# Altium footprint library TranDangKhoa-LIB.PcbLib: 1435 footprints (part 83 of 90)
Each footprint in its own frame and in the unit in brackets; x right, y up, seen from the top. Pads: shape width x height; smd on the part's side, far side on the other; paste and mask are expansions set on the pad; w line width, h text height; cw(c..) or ccw(c..) is an arc to the next point about the centre after c.
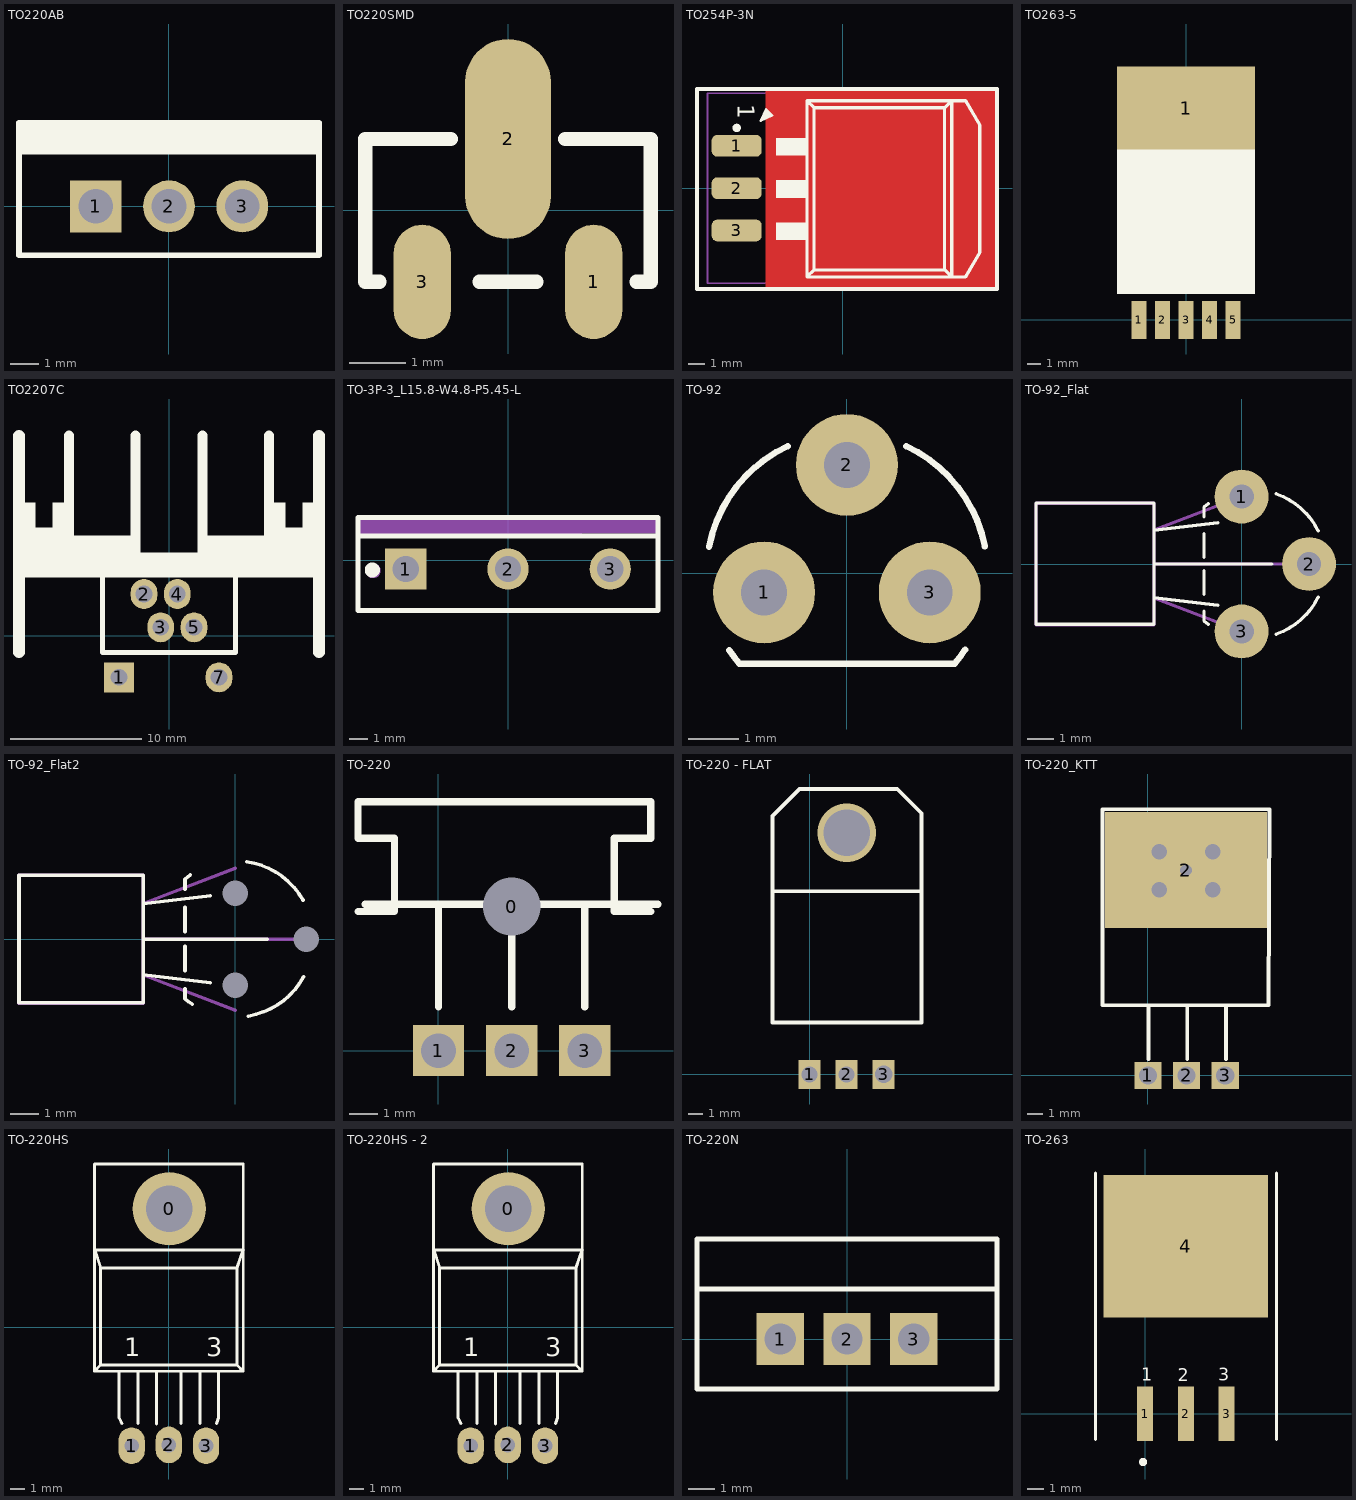
[diagram p82: the footprints below, top view; thin cyan lines are the x and y axes]

## TO220AB [mm] "TO, Thru-Hole, Vertical, Heatsink Mounted; 3 In-Line Leads; Pitch 2.54 mm; Pin sequence 1, 3, 2"
height 16.4
pads (3):
  rect 1.8x1.8 hole 1.2: 1(-2.54,0)
  round 1.8 hole 1.2: 2(0,0) 3(2.54,0)
Top Overlay:
  rectangle: -5.2,1.892 5.2,2.9
  lines w0.2: -5.2,1.892 5.2,1.892 ; -5.2,-1.7 5.2,-1.7 5.2,2.9 -5.2,2.9 -5.2,-1.7

## TO220SMD [mil]
pads (3):
  oval 40x80 smd: 1(60,-50) 3(-60,-50)
  oval 60x140 smd: 2(0,50)
Top Overlay:
  lines w10: -90,-50 -100,-50 -100,50 -60,50 -40,50 ; -20,-50 20,-50 ; 40,50 100,50 100,-50 90,-50

## TO254P-3N [mm]
pads (3):
  rrect50% 3x1.3 smd: 1(-6.35,2.54) 2(-6.35,0) 3(-6.35,-2.54)
Top Layer:
  region: -4.634,5.949 -4.634,-6.051 9.258,-6.051 9.258,5.949
Top Overlay:
  circle w0.25: c-6.35,3.615 r0.125
  region: -3.988,3.023 -3.988,1.956 -2.108,1.956 -2.108,3.023
  region: -3.988,-2.057 -3.988,-3.124 -2.108,-3.124 -2.108,-2.057
  region: -3.988,0.483 -3.988,-0.584 -2.108,-0.584 -2.108,0.483
  lines w0.127: -4.919,4.028 -4.208,4.358 -4.4,4.547 ; -4.919,4.028 -4.589,4.739 -4.4,4.547 ; -4.919,4.028 -4.4,4.547
  lines w0.178: -4.716,4.383 -4.538,4.561 ; -4.564,4.231 -4.386,4.409
  lines w0.2: -2.134,-5.329 -2.134,5.254 ; -2.134,-5.329 6.545,-5.329 ; -2.134,-5.329 -1.71,-4.906 ; -2.134,5.254 6.545,5.254 ; -2.134,5.254 -1.71,4.831 ; -1.71,-4.906 6.121,-4.906 ; -1.71,-4.906 -1.71,4.831 ; -1.71,4.831 6.121,4.831 ; 6.121,-4.906 6.121,4.831 ; 6.121,-4.906 6.545,-5.329 ; 6.121,4.831 6.545,5.254 ; 6.545,-5.329 6.545,5.254 ; 6.545,-5.329 7.366,-5.329 8.238,-3.847 8.238,3.773 7.366,5.254 6.545,5.254
  lines w0.254: -8.731,-6.051 9.269,-6.051 9.269,5.949 -8.731,5.949 -8.731,-6.051
  text "1" at -6.299,5.026 h1
Top Paste:
  region: -0.431,3.773 -0.431,-3.847 7.595,-3.847 7.595,3.773
Top Solder:
  region: -2.413,5.506 -2.413,-5.62 8.179,-5.62 8.179,5.506
  lines w0.254: 8.554,-3.938 8.131,-5.419 ; 8.554,3.863 8.131,5.344 ; -2.462,-5.329 ccw(c-2.134,-5.329) -2.134,-5.658 ; -2.462,-5.329 ccw(c-2.134,-5.329) -2.134,-5.658 ; -2.462,-5.329 -2.462,5.254 ; -2.462,5.254 cw(c-2.134,5.254) -2.134,5.583 ; -2.462,5.254 cw(c-2.134,5.254) -2.134,5.583 ; -2.134,-5.658 6.545,-5.658 7.815,-5.658 ; -2.134,5.583 6.545,5.583 7.815,5.583 ; 7.815,-5.658 ccw(c7.815,-5.329) 8.131,-5.42 ; 7.815,-5.658 ccw(c7.815,-5.329) 8.131,-5.42 ; 7.815,5.583 cw(c7.815,5.254) 8.131,5.345 ; 7.815,5.583 cw(c7.815,5.254) 8.131,5.345 ; 8.567,-3.847 cw(c8.238,-3.847) 8.554,-3.938 ccw(c8.238,-3.847) 8.567,-3.847 ; 8.567,-3.847 8.567,3.773 ; 8.567,3.773 ccw(c8.238,3.773) 8.554,3.863 cw(c8.238,3.773) 8.567,3.773
  lines w0.508: 8.196,-4.669 8.196,4.577
Mechanical 13:
  lines w0.1: -2.675,-4.985 -2.675,4.985 6.475,4.985 6.475,-4.985 -2.675,-4.985
Mechanical 15:
  lines w0.1: -0.5,0 0.5,0 ; 0,-0.5 0,0.5 ; -8.1,-5.7 -8.1,5.7 8.1,5.7 8.1,-5.7 -8.1,-5.7
3D body "254-3.STEP": height 2.53, standoff -0.02, extent -7.339,-5.087 8.101,5.08

## TO263-5 [mm] "LM2576-SMD"
pads (6):
  rect 1.07x2.75 smd: 1(-3.4,-0.025) 2(-1.7,-0.025) 3(0,-0.025) 4(1.7,-0.025) 5(3.4,-0.025)
  rect 10x6 smd: 1(0,15.289)
Top Overlay:
  rectangle: -5,1.854 5,12.878
3D body "SW3dPS-TO263-5.STEP": height 4.79, standoff -0.01, extent -5,-0.381 5,15.289

## TO2207C [mil] "DIP; 7 Leads; Row Spacing 7.62 mm; Pitch 2.54 mm"
height 209.84
pads (6):
  rect 90x90 hole 50: 1(-150,-125)
  oval 80x90 hole 50: 2(-75,125) 3(-25,25) 4(25,125) 5(75,25) 7(150,-125)
Top Overlay:
  rectangle: -450,175 450,250
  rectangle: -450,225 -300,325
  rectangle: 300,225 450,325
  rectangle: -300,225 -100,300
  rectangle: 100,225 300,300
  rectangle: 300,325 350,400
  rectangle: 400,300 450,400
  rectangle: -450,300 -400,400
  rectangle: -350,300 -300,400
  lines w15: -200,225 -200,-50 200,-50 200,205
  lines w30: -300,225 -300,600 ; -100,225 -100,600 ; 100,225 100,600 ; 300,250 300,600
  lines w35: -450,-50 -450,600 ; 450,-50 450,600

## TO-3P-3_L15.8-W4.8-P5.45-L [mm]
pads (3):
  rect 2.2x2.2 hole 1.4 paste-2539.97 mask+0.051: 1(-5.448,-0.458)
  round 2.2 hole 1.4 paste-2539.97 mask+0.051: 2(0.002,-0.458) 3(5.452,-0.458)
Top Overlay:
  circle w0.4: c-7.238,-0.508 r0.2
  lines w0.254: -7.999,1.312 8.001,1.312 ; -8.001,-2.665 8.001,-2.665 8.001,2.288 -8.001,2.288 -8.001,-2.665
Mechanical 15:
  circle w0.4: c-7.198,-0.548 r0.2
  region: -7.998,1.342 -7.998,2.242 7.902,2.242 7.902,1.442

## TO-92 [mil]
height 397.64
pads (3):
  round 80 hole 36: 1(-65,-15) 2(0,85) 3(65,-15)
Top Overlay:
  lines w5: -108.17,20.72 cw(c0.08,-0.14) -46.51,99.77 ; -92.29,-60.31 ccw(c0.08,-0.14) -84.37,-71 84.52,-71 ccw(c0.08,-0.14) 92.73,-59.88 ; 46.67,99.77 cw(c0.08,-0.14) 108.27,21.01
3D body "TO-92_A.stp": height 404.72, standoff -100, extent -94.56,-69.52 94.57,92.49

## TO-92_Flat [mil]
height 151.57
pads (3):
  round 80 hole 36: 1(0,100) 2(100,0) 3(0,-100)
Top Overlay:
  lines w5: -130.03,0 45,0 ; -130,-50 -35.14,-61.16 ; -130,50 -35.14,61.16 ; -55.86,-70 -55.86,-84.45 ccw(c15,0) -49.54,-89.37 ; -55.86,-45 -55.86,-10 ; -55.86,10 -55.86,45 ; -55.86,70 -55.86,84.45 cw(c15,0) -49.54,89.37 ; 51.42,-104.05 ccw(c15,0) 113.6,-49.3 ; 51.42,104.05 cw(c15,0) 113.6,49.3 ; -305.03,-89.45 -130.03,-89.45 -130.03,90.55 -305.03,90.55 -305.03,-89.45
Mechanical 13:
  lines w5: -130,-50.44 0,-100 ; -130,0.1 100,0 ; -130,50.44 0,100 ; -305,-90 -130,-90 -130,90 -305,90 -305,-90
3D body "TO-92_Flat.STEP": height 141.73, standoff -100, extent -307.08,-109.84 109.85,109.85

## TO-92_Flat2 [mil]
height 151.57
pads (3):
  round 0 / inner round 0 / far side round 80 hole 36 unplated: 1(0,65) 2(100,0) 3(0,-65)
Top Overlay:
  lines w5: -130.03,0 45,0 ; -130,-50 -35.14,-61.16 ; -130,50 -35.14,61.16 ; -70.97,-69.58 -70.97,-84.02 ccw(c-0.11,0.42) -61.02,-91.46 ; -70.97,-44.58 -70.97,-9.58 ; -70.97,10.42 -70.97,45.42 ; -70.97,70.42 -70.97,84.87 cw(c-0.11,0.42) -63.33,90.73 ; 15.8,109.5 cw(c-0.11,0.42) 95.43,55.41 ; 18.4,-108.25 ccw(c-0.11,0.42) 96.42,-52.82 ; -305.03,-89.45 -305.03,90.55 -130.03,90.55 -130.03,-89.45 -305.03,-89.45
Mechanical 13:
  lines w5: -130,-50.44 0,-100 ; -130,0.1 100,0 ; -130,50.44 0,100 ; -305,-90 -305,90 -130,90 -130,-90 -305,-90
3D body "TO-92_Flat_Narrow.STEP": height 141.73, standoff -100, extent -307.08,-94.48 109.85,94.5

## TO-220 [mil]
pads (4):
  round 70 hole 78.74 unplated: 0(100,196.85)
  rect 70x70 hole 47.24 unplated: 1(0,0) 2(100,0) 3(200,0)
Top Overlay:
  lines w10: -110,190 -60,190 -60,290 -110,290 -110,340 290,340 290,290 240,290 240,190 290,190 ; -100,200 300,200 ; 0,60 0,200 ; 100,60 100,200 ; 200,60 200,200

## TO-220 - FLAT [mm]
pads (3):
  rect 1.5x2 hole 1.1: 1(0,0) 2(2.54,0)
  rect 1.5x2 hole 1.2: 3(5.08,0)
via 2.54,16.562 diameter 4 hole 3.2
Top Overlay:
  lines w0.254: -2.54,5.861 -2.54,17.71 -0.686,19.564 6.007,19.564 7.671,17.901 7.671,3.562 -2.54,3.562 -2.54,12.554 7.671,12.554
3D body "TO220_NAM.step": height 4.45, standoff -1.79, extent -2.54,-0.19 7.62,19.09

## TO-220_KTT [mil]
pads (4):
  rect 70x70 hole 47.24 unplated: 1(0,0) 2(100,0) 3(200,0)
  rect 420x300 hole 30 unplated: 2(98.42,531.5)
via 29.53,579.13 diameter 50 hole 40
via 167.32,579.13 diameter 50 hole 40
via 29.53,480.71 diameter 50 hole 40
via 167.32,480.71 diameter 50 hole 40
Top Overlay:
  lines w10: -98.35,631.89 -97.56,631.89 ; 1.65,41.89 1.65,181.89 ; 101.65,41.89 101.65,181.89 ; 201.65,41.89 201.65,181.89 ; -118.11,688.98 -118.03,181.89 311.5,181.89 314.96,688.98 -118.11,688.98

## TO-220HS [mm] "Empaque TO-220 Horizontal"
pads (4):
  round 5 hole 3.175: 0(0.032,8.088)
  oval 1.8x2.5 hole 1: 1(-2.54,-8.088) 2(0.007,-8.037) 3(2.54,-8.088)
Top Overlay:
  lines w0.2: -5.08,11.138 -5.08,9.48 -5.08,-3.008 ; -5.066,5.333 -4.643,4.063 ; -5.053,5.263 5.107,5.263 ; -5.043,11.138 5.08,11.138 5.08,9.48 5.08,6.94 5.08,-3.008 ; -4.657,3.988 -4.657,-2.585 ; -4.656,4.038 4.657,4.038 ; -3.387,-3.008 -3.387,-6.183 -3.195,-6.588 ; -2.117,-6.588 -2.117,-3.008 ; -0.847,-6.612 -0.847,-3.008 ; 0.847,-6.587 0.847,-3.008 ; 2.117,-6.588 2.117,-3.008 ; 3.251,-6.588 3.387,-6.183 3.387,-3.008 ; 4.657,3.963 4.657,-2.585 ; 4.657,4.063 5.081,5.333 ; -5.08,-3.008 -4.657,-2.585 ; -5.08,-3.008 5.08,-3.008 ; -4.657,-2.585 4.657,-2.585 ; 4.657,-2.585 5.08,-3.008
  text "1" at -3.048,-1.992 h1.27
  text "3" at 2.54,-1.992 h1.27
3D body "SW3DPS-TO-220-DEFAULT.STEP": height 4.3, standoff -2.9, extent -5.043,-8.407 5.117,11.083

## TO-220HS - 2 [mm] "Empaque TO-220 Horizontal"
pads (4):
  round 5 hole 3.175: 0(0.032,8.088)
  oval 1.8x2.5 hole 1: 1(-2.54,-8.088) 2(0.007,-8.037) 3(2.54,-8.088)
Top Overlay:
  lines w0.2: -5.08,11.138 -5.08,9.48 -5.08,-3.008 ; -5.066,5.333 -4.643,4.063 ; -5.053,5.263 5.107,5.263 ; -5.043,11.138 5.08,11.138 5.08,9.48 5.08,6.94 5.08,-3.008 ; -4.657,3.988 -4.657,-2.585 ; -4.656,4.038 4.657,4.038 ; -3.387,-3.008 -3.387,-6.183 -3.195,-6.588 ; -2.117,-6.588 -2.117,-3.008 ; -0.847,-6.612 -0.847,-3.008 ; 0.847,-6.587 0.847,-3.008 ; 2.117,-6.588 2.117,-3.008 ; 3.251,-6.588 3.387,-6.183 3.387,-3.008 ; 4.657,3.963 4.657,-2.585 ; 4.657,4.063 5.081,5.333 ; -5.08,-3.008 -4.657,-2.585 ; -5.08,-3.008 5.08,-3.008 ; -4.657,-2.585 4.657,-2.585 ; 4.657,-2.585 5.08,-3.008
  text "1" at -3.048,-1.992 h1.27
  text "3" at 2.54,-1.992 h1.27
3D body "TO220 L.step": height 4.5, standoff -3, extent -5.003,-8.214 4.997,11.49

## TO-220N [mm]
pads (3):
  rect 1.8x2 hole 1.2: 1(-2.54,0) 2(0,0) 3(2.54,0)
Top Overlay:
  lines w0.2: -5.715,1.905 5.715,1.905 ; -5.715,-1.905 -5.715,2.54 -5.715,3.81 5.715,3.81 5.715,-1.905 -5.715,-1.905
3D body "User Library-TO-220-3.step": height 8.08, standoff -20.7, extent -4.925,-2.134 4.975,2.366

## TO-263 [mm] "D2-PACK SIP-G3/P2.54"
height 1
pads (4):
  rect 1x3.4 smd: 1(0,0) 2(2.54,0) 3(5.08,0)
  rect 10.25x8.9 smd: 4(2.54,10.45)
Top Overlay:
  circle w0.25: c-0.125,-3 r0.125
  lines w0.2: -3.1,-1.6 -3.1,15 ; 8.2,-1.6 8.2,15
  text "2" at 2.032,2.032 h0.8
  text "3" at 4.572,2.075 h0.8
  text "1" at -0.25,2.075 h0.8